# Altium footprint library con-molex.PCBLIB: 369 footprints (part 2 of 26)
Each footprint in its own frame and in the unit in brackets; x right, y up, seen from the top. Pads: shape width x height; smd on the part's side, far side on the other; paste and mask are expansions set on the pad; w line width, h text height; cw(c..) or ccw(c..) is an arc to the next point about the centre after c.
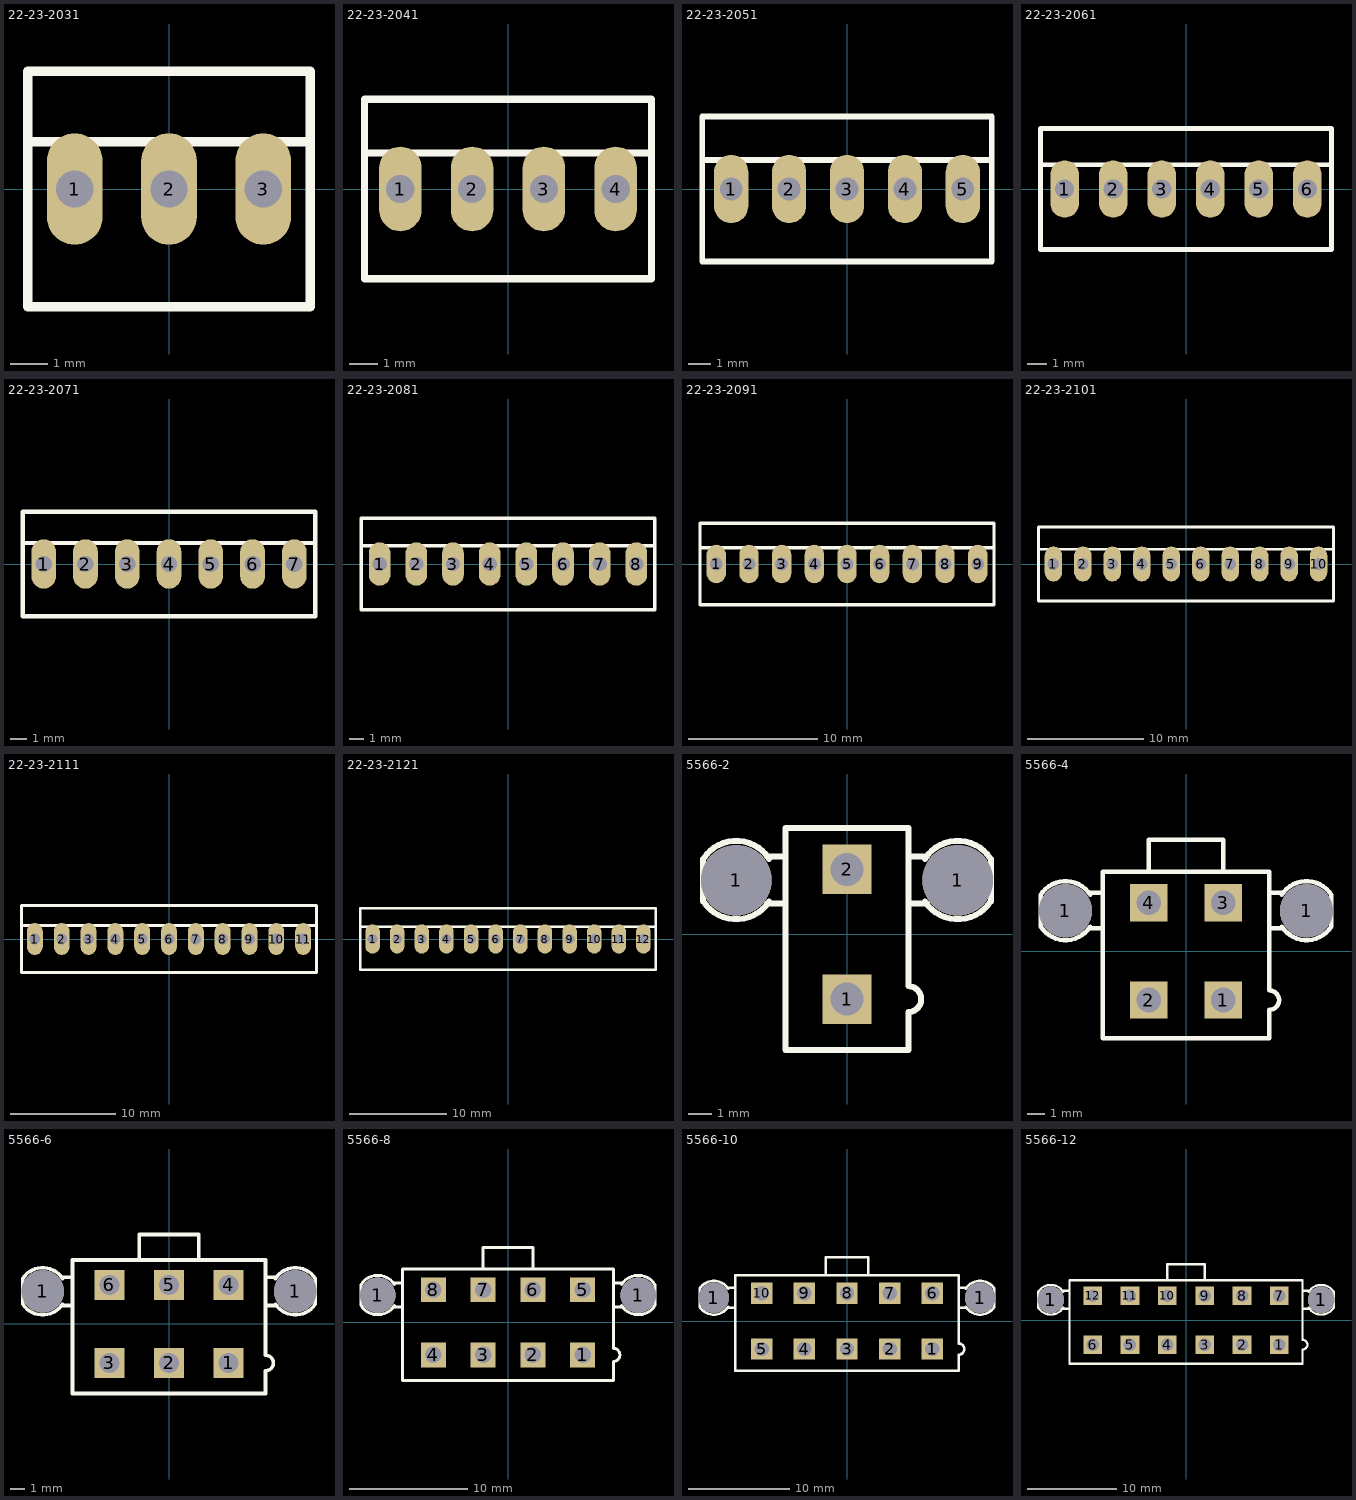
[diagram p1: the footprints below, top view; thin cyan lines are the x and y axes]

## 22-23-2031 [mm]
pads (3):
  oval 1.5x3 hole 1: 1(-2.54,0) 2(0,0) 3(2.54,0)
Top Overlay:
  lines w0.254: -3.81,1.27 -3.81,-3.175 3.81,-3.175 3.81,1.27 ; -3.81,1.27 -3.81,3.175 3.81,3.175 3.81,1.27 ; -3.81,1.27 3.81,1.27

## 22-23-2041 [mm]
pads (4):
  oval 1.5x3 hole 1: 1(-3.81,0) 2(-1.27,0) 3(1.27,0) 4(3.81,0)
Top Overlay:
  lines w0.254: -5.08,1.27 -5.08,-3.175 5.08,-3.175 5.08,1.27 ; -5.08,1.27 -5.08,3.175 5.08,3.175 5.08,1.27 ; -5.08,1.27 5.08,1.27

## 22-23-2051 [mm]
pads (5):
  oval 1.5x3 hole 1: 1(-5.08,0) 2(-2.54,0) 3(0,0) 4(2.54,0) 5(5.08,0)
Top Overlay:
  lines w0.254: -6.35,1.27 -6.35,-3.175 6.35,-3.175 6.35,1.27 ; -6.35,1.27 -6.35,3.175 6.35,3.175 6.35,1.27 ; -6.35,1.27 6.35,1.27

## 22-23-2061 [mm]
pads (6):
  oval 1.5x3 hole 1: 1(-6.35,0) 2(-3.81,0) 3(-1.27,0) 4(1.27,0) 5(3.81,0) 6(6.35,0)
Top Overlay:
  lines w0.254: -7.62,1.27 -7.62,-3.175 7.62,-3.175 7.62,1.27 ; -7.62,1.27 -7.62,3.175 7.62,3.175 7.62,1.27 ; -7.62,1.27 7.62,1.27

## 22-23-2071 [mm]
pads (7):
  oval 1.5x3 hole 1: 1(-7.62,0) 2(-5.08,0) 3(-2.54,0) 4(0,0) 5(2.54,0) 6(5.08,0) 7(7.62,0)
Top Overlay:
  lines w0.254: -8.89,1.27 -8.89,-3.175 8.89,-3.175 8.89,1.27 ; -8.89,1.27 -8.89,3.175 8.89,3.175 8.89,1.27 ; -8.89,1.27 8.89,1.27

## 22-23-2081 [mm]
pads (8):
  oval 1.5x3 hole 1: 1(-8.89,0) 2(-6.35,0) 3(-3.81,0) 4(-1.27,0) 5(1.27,0) 6(3.81,0) 7(6.35,0) 8(8.89,0)
Top Overlay:
  lines w0.254: -10.16,1.27 -10.16,-3.175 10.16,-3.175 10.16,1.27 ; -10.16,1.27 -10.16,3.175 10.16,3.175 10.16,1.27 ; -10.16,1.27 10.16,1.27

## 22-23-2091 [mm]
pads (9):
  oval 1.5x3 hole 1: 1(-10.16,0) 2(-7.62,0) 3(-5.08,0) 4(-2.54,0) 5(0,0) 6(2.54,0) 7(5.08,0) 8(7.62,0) 9(10.16,0)
Top Overlay:
  lines w0.254: -11.43,1.27 -11.43,-3.175 11.43,-3.175 11.43,1.27 ; -11.43,1.27 -11.43,3.175 11.43,3.175 11.43,1.27 ; -11.43,1.27 11.43,1.27

## 22-23-2101 [mm]
pads (10):
  oval 1.5x3 hole 1: 1(-11.43,0) 2(-8.89,0) 3(-6.35,0) 4(-3.81,0) 5(-1.27,0) 6(1.27,0) 7(3.81,0) 8(6.35,0) 9(8.89,0) 10(11.43,0)
Top Overlay:
  lines w0.254: -12.7,1.27 -12.7,-3.175 12.7,-3.175 12.7,1.27 ; -12.7,1.27 -12.7,3.175 12.7,3.175 12.7,1.27 ; -12.7,1.27 12.7,1.27

## 22-23-2111 [mm]
pads (11):
  oval 1.5x3 hole 1: 1(-12.7,0) 2(-10.16,0) 3(-7.62,0) 4(-5.08,0) 5(-2.54,0) 6(0,0) 7(2.54,0) 8(5.08,0) 9(7.62,0) 10(10.16,0) 11(12.7,0)
Top Overlay:
  lines w0.254: -13.97,1.27 -13.97,-3.175 13.97,-3.175 13.97,1.27 ; -13.97,1.27 -13.97,3.175 13.97,3.175 13.97,1.27 ; -13.97,1.27 13.97,1.27

## 22-23-2121 [mm]
pads (12):
  oval 1.5x3 hole 1: 1(-13.97,0) 2(-11.43,0) 3(-8.89,0) 4(-6.35,0) 5(-3.81,0) 6(-1.27,0) 7(1.27,0) 8(3.81,0) 9(6.35,0) 10(8.89,0) 11(11.43,0) 12(13.97,0)
Top Overlay:
  lines w0.254: -15.24,1.27 -15.24,-3.175 15.24,-3.175 15.24,1.27 ; -15.24,1.27 -15.24,3.175 15.24,3.175 15.24,1.27 ; -15.24,1.27 15.24,1.27

## 5566-2 [mm]
pads (4):
  round 3 hole 3: 1(-4.7,2.29) 1(4.7,2.29)
  rect 2.1x2.1 hole 1.4: 1(0,-2.75) 2(0,2.75)
Top Overlay:
  lines w0.254: -3.4,1.3 -2.7,1.3 ; -3.4,3.3 -2.7,3.3 ; -3.3,1.4 cw(c-4.7,2.3) -6.1,1.4 -6.1,3.2 cw(c-4.7,2.3) -3.3,3.2 ; 2.7,1.3 3.4,1.3 ; 2.7,3.3 3.4,3.3 ; 3.3,1.4 ccw(c4.7,2.3) 6.1,1.4 6.1,3.2 ccw(c4.7,2.3) 3.3,3.2 ; -2.6,-4.9 -2.6,4.5 2.6,4.5 2.6,-2.2 cw(c2.6,-2.75) 2.6,-3.3 2.6,-4.9 -2.6,-4.9

## 5566-4 [mm]
pads (6):
  round 3 hole 3: 1(-6.8,2.29) 1(6.8,2.29)
  rect 2.1x2.1 hole 1.4: 1(2.1,-2.75) 2(-2.1,-2.75) 3(2.1,2.75) 4(-2.1,2.75)
Top Overlay:
  lines w0.254: -5.5,1.3 -4.8,1.3 ; -5.5,3.3 -4.8,3.3 ; -5.4,1.4 cw(c-6.8,2.3) -8.2,1.4 -8.2,3.2 cw(c-6.8,2.3) -5.4,3.2 ; -2.1,4.6 -2.1,6.3 2.1,6.3 2.1,4.6 ; 4.8,1.3 5.5,1.3 ; 4.8,3.3 5.5,3.3 ; 5.4,1.4 ccw(c6.8,2.3) 8.2,1.4 8.2,3.2 ccw(c6.8,2.3) 5.4,3.2 ; -4.7,-4.9 4.7,-4.9 4.7,-3.3 ccw(c4.7,-2.75) 4.7,-2.2 4.7,4.5 -4.7,4.5 -4.7,-4.9

## 5566-6 [mm]
pads (8):
  round 3 hole 3: 1(-8.9,2.29) 1(8.9,2.29)
  rect 2.1x2.1 hole 1.4: 1(4.2,-2.75) 2(0,-2.75) 3(-4.2,-2.75) 4(4.2,2.75) 5(0,2.75) 6(-4.2,2.75)
Top Overlay:
  lines w0.254: -7.6,1.3 -6.9,1.3 ; -7.6,3.3 -6.9,3.3 ; -7.5,1.4 cw(c-8.9,2.3) -10.3,1.4 -10.3,3.2 cw(c-8.9,2.3) -7.5,3.2 ; -2.1,4.6 -2.1,6.3 2.1,6.3 2.1,4.6 ; 6.9,1.3 7.6,1.3 ; 6.9,3.3 7.6,3.3 ; 7.5,1.4 ccw(c8.9,2.3) 10.3,1.4 10.3,3.2 ccw(c8.9,2.3) 7.5,3.2 ; -6.8,-4.9 6.8,-4.9 6.8,-3.3 ccw(c6.8,-2.75) 6.8,-2.2 6.8,4.5 -6.8,4.5 -6.8,-4.9

## 5566-8 [mm]
pads (10):
  round 3 hole 3: 1(-11,2.29) 1(11,2.29)
  rect 2.1x2.1 hole 1.4: 1(6.3,-2.75) 2(2.1,-2.75) 3(-2.1,-2.75) 4(-6.3,-2.75) 5(6.3,2.75) 6(2.1,2.75) 7(-2.1,2.75) 8(-6.3,2.75)
Top Overlay:
  lines w0.254: -9.7,1.3 -9,1.3 ; -9.7,3.3 -9,3.3 ; -9.6,1.4 cw(c-11,2.3) -12.4,1.4 -12.4,3.2 cw(c-11,2.3) -9.6,3.2 ; -2.1,4.6 -2.1,6.3 2.1,6.3 2.1,4.6 ; 9,1.3 9.7,1.3 ; 9,3.3 9.7,3.3 ; 9.6,1.4 ccw(c11,2.3) 12.4,1.4 12.4,3.2 ccw(c11,2.3) 9.6,3.2 ; -8.9,-4.9 8.9,-4.9 8.9,-3.3 ccw(c8.9,-2.75) 8.9,-2.2 8.9,4.5 -8.9,4.5 -8.9,-4.9

## 5566-10 [mm]
pads (12):
  round 3 hole 3: 1(-13.1,2.29) 1(13.1,2.29)
  rect 2.1x2.1 hole 1.4: 1(8.4,-2.75) 2(4.2,-2.75) 3(0,-2.75) 4(-4.2,-2.75) 5(-8.4,-2.75) 6(8.4,2.75) 7(4.2,2.75) 8(0,2.75) 9(-4.2,2.75) 10(-8.4,2.75)
Top Overlay:
  lines w0.254: -11.8,1.3 -11.1,1.3 ; -11.8,3.3 -11.1,3.3 ; -11.7,1.4 cw(c-13.1,2.3) -14.5,1.4 -14.5,3.2 cw(c-13.1,2.3) -11.7,3.2 ; -2.1,4.6 -2.1,6.3 2.1,6.3 2.1,4.6 ; 11.1,1.3 11.8,1.3 ; 11.1,3.3 11.8,3.3 ; 11.7,1.4 ccw(c13.1,2.3) 14.5,1.4 14.5,3.2 ccw(c13.1,2.3) 11.7,3.2 ; -11,-4.9 11,-4.9 11,-3.3 ccw(c11,-2.75) 11,-2.2 11,4.5 -11,4.5 -11,-4.9

## 5566-12 [mm]
pads (14):
  round 3 hole 3: 1(-15.2,2.29) 1(15.2,2.29)
  rect 2.1x2.1 hole 1.4: 1(10.5,-2.75) 2(6.3,-2.75) 3(2.1,-2.75) 4(-2.1,-2.75) 5(-6.3,-2.75) 6(-10.5,-2.75) 7(10.5,2.75) 8(6.3,2.75) 9(2.1,2.75) 10(-2.1,2.75) 11(-6.3,2.75) 12(-10.5,2.75)
Top Overlay:
  lines w0.254: -13.9,1.3 -13.2,1.3 ; -13.9,3.3 -13.2,3.3 ; -13.8,1.4 cw(c-15.2,2.3) -16.6,1.4 -16.6,3.2 cw(c-15.2,2.3) -13.8,3.2 ; -2.1,4.6 -2.1,6.3 2.1,6.3 2.1,4.6 ; 13.2,1.3 13.9,1.3 ; 13.2,3.3 13.9,3.3 ; 13.8,1.4 ccw(c15.2,2.3) 16.6,1.4 16.6,3.2 ccw(c15.2,2.3) 13.8,3.2 ; -13.1,-4.9 13.1,-4.9 13.1,-3.3 ccw(c13.1,-2.75) 13.1,-2.2 13.1,4.5 -13.1,4.5 -13.1,-4.9